# Altium footprint library agh_racing_2018.PcbLib: 166 footprints (part 4 of 11)
Each footprint in its own frame and in the unit in brackets; x right, y up, seen from the top. Pads: shape width x height; smd on the part's side, far side on the other; paste and mask are expansions set on the pad; w line width, h text height; cw(c..) or ccw(c..) is an arc to the next point about the centre after c.
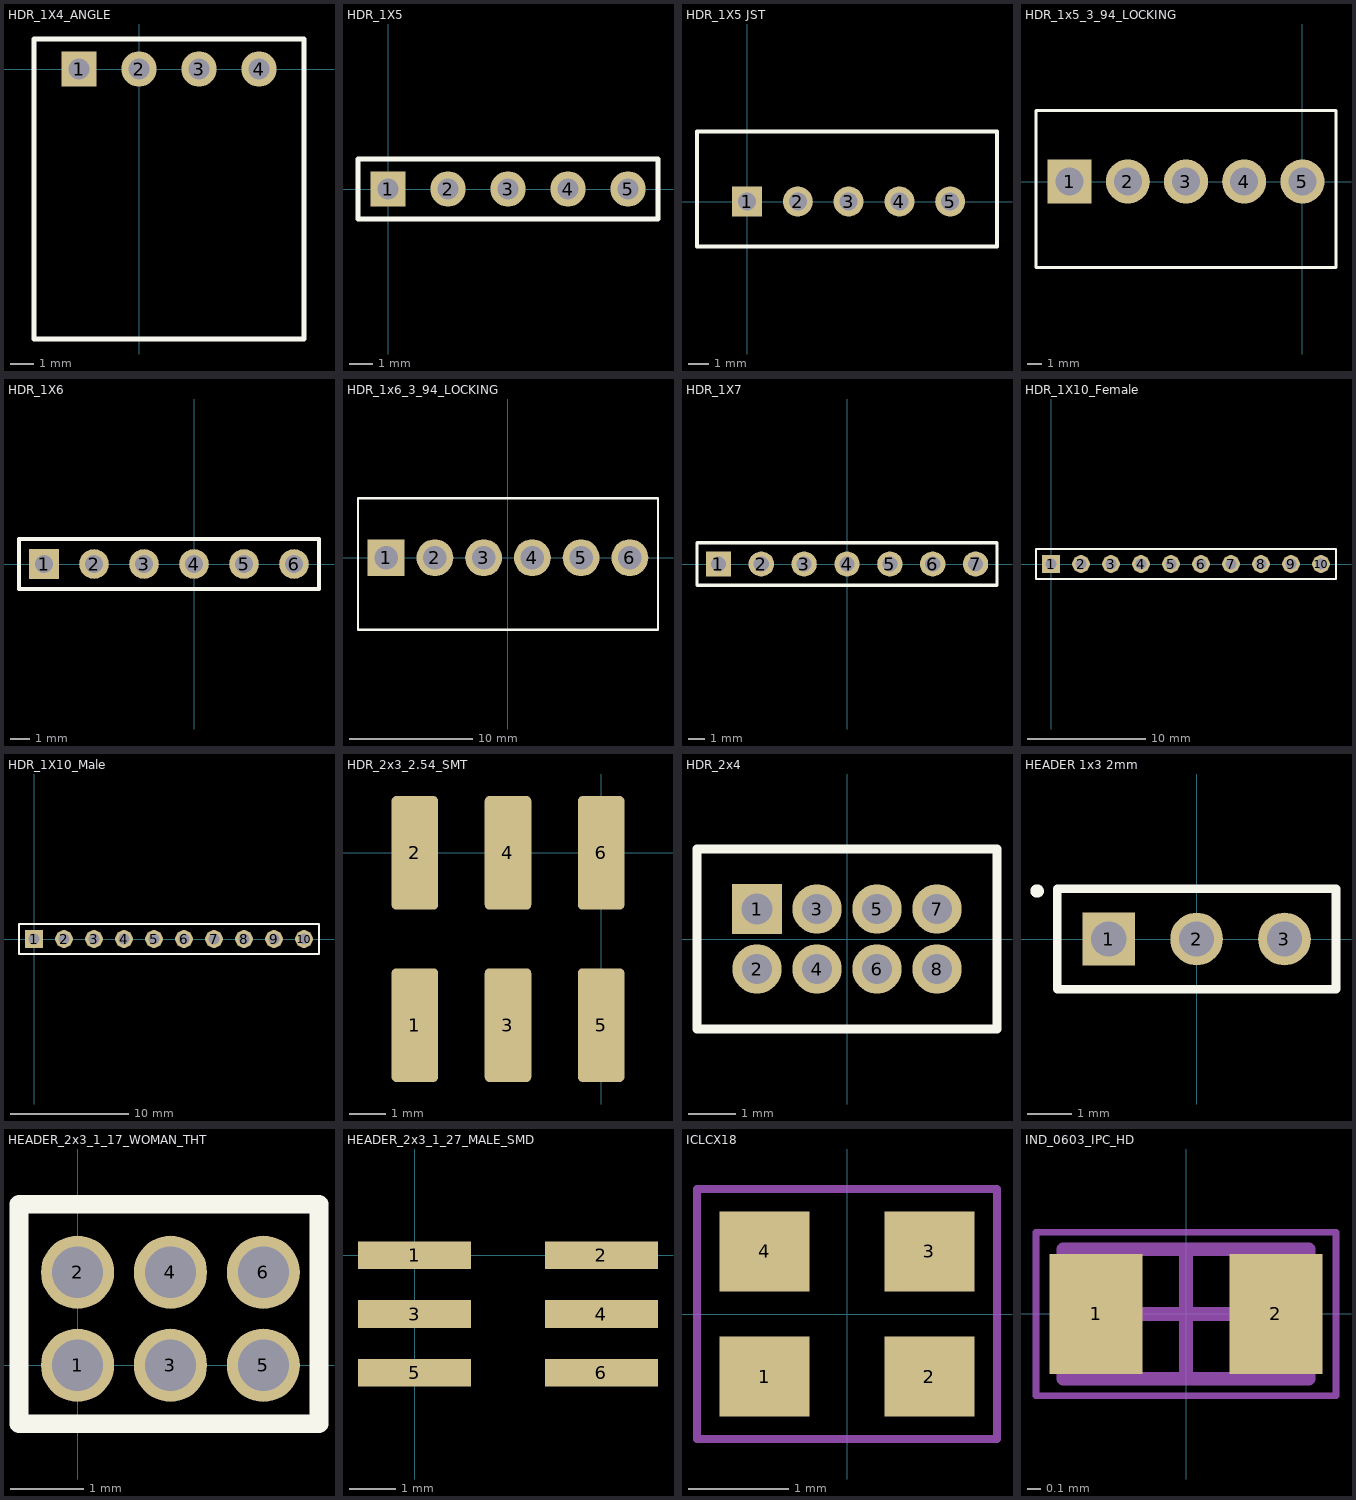
[diagram p3: the footprints below, top view; thin cyan lines are the x and y axes]

## HDR_1X4_ANGLE [mm] "Connector; Header; 3 Position"
pads (4):
  rect 1.5x1.5 hole 0.9: 1(-2.54,0)
  round 1.5 hole 0.9: 2(0,0) 3(2.54,0) 4(5.08,0)
Top Overlay:
  lines w0.2: -4.445,-11.43 6.985,-11.43 6.985,1.27 -4.445,1.27 -4.445,-11.43
3D body "c-0640457-02-s-3d.stp": height 5.84, standoff -3.55, extent 1.27,-10.733 6.35,0.316
3D body "c-0640457-02-s-3d.stp": height 5.84, standoff -3.55, extent -3.81,-10.733 1.27,0.316

## HDR_1X5 [mm] "Connector; Header; 5 Position"
pads (5):
  rect 1.5x1.5 hole 0.9: 1(0,0)
  round 1.5 hole 0.9: 2(2.54,0) 3(5.08,0) 4(7.62,0) 5(10.16,0)
Top Overlay:
  lines w0.2: -1.27,-1.27 11.43,-1.27 11.43,1.27 -1.27,1.27 -1.27,-1.27
3D body "DS1021-1x5SF11.stp": height 8.6, standoff -3, extent -1.27,-1.27 11.43,1.27

## HDR_1X5 JST [mm] "Connector; Header; 5 Position"
pads (5):
  rect 1.5x1.5 hole 0.9: 1(0,0)
  round 1.5 hole 0.9: 2(2.54,0) 3(5.08,0) 4(7.62,0) 5(10.16,0)
Top Overlay:
  lines w0.2: -2.5,-2.25 -2.5,3.5 12.5,3.5 12.5,-2.25 -2.5,-2.25
3D body "JST XH 5 B5B-XH-A.STEP": height 7, standoff -3.45, extent -2.395,-2.35 12.545,3.4

## HDR_1x5_3_94_LOCKING [mm]
pads (5):
  rect 3x3 hole 1.9: 1(-15.84,0)
  round 3 hole 1.9: 2(-11.88,0) 3(-7.92,0) 4(-3.96,0) 5(0,0)
Top Overlay:
  lines w0.2: -18.126,-5.842 -18.126,4.826 2.286,4.826 2.286,-5.842 -18.126,-5.842
3D body "Download_STP_645005114822.stp": height 13.85, standoff -3.6, extent -17.921,-5.605 1.989,4.598

## HDR_1X6 [mm]
pads (6):
  rect 1.5x1.5 hole 0.9: 1(-7.62,0)
  round 1.5 hole 0.9: 2(-5.08,0) 3(-2.54,0) 4(0,0) 5(2.54,0) 6(5.08,0)
Top Overlay:
  lines w0.2: -8.89,-1.27 1.27,-1.27 6.35,-1.27 6.35,1.27 1.27,1.27 -8.89,1.27 -8.89,-1.27
3D body "DS1021-1x3SF11.stp": height 8.6, standoff -3, extent -1.27,-1.27 6.35,1.27
3D body "DS1021-1x4SF11.stp": height 8.6, standoff -3, extent -8.89,-1.27 1.27,1.27

## HDR_1x6_3_94_LOCKING [mm]
pads (6):
  rect 3x3 hole 1.9: 1(-9.9,0)
  round 3 hole 1.9: 2(-5.94,0) 3(-1.98,0) 4(1.98,0) 5(5.94,0) 6(9.9,0)
Top Overlay:
  lines w0.2: -12.186,-5.842 -12.186,4.826 12.186,4.826 12.186,-5.842 -12.186,-5.842
3D body "Download_STP_645006114822.stp": height 13.85, standoff -3.6, extent -11.935,-5.605 11.935,4.597

## HDR_1X7 [mm]
pads (7):
  rect 1.5x1.5 hole 0.9: 1(-7.62,0)
  round 1.5 hole 0.9: 2(-5.08,0) 3(-2.54,0) 4(0,0) 5(2.54,0) 6(5.08,0) 7(7.62,0)
Top Overlay:
  lines w0.2: -8.89,-1.27 1.27,-1.27 8.89,-1.27 8.89,1.27 1.27,1.27 -8.89,1.27 -8.89,-1.27
3D body "DS1021-1x3SF11.stp": height 8.6, standoff -3, extent 1.27,-1.27 8.89,1.27
3D body "DS1021-1x4SF11.stp": height 8.6, standoff -3, extent -8.89,-1.27 1.27,1.27

## HDR_1X10_Female [mm] "Connector; Header; 10 Position"
height 8.5
pads (10):
  rect 1.5x1.5 hole 0.9: 1(0,0)
  round 1.5 hole 0.9: 2(2.54,0) 3(5.08,0) 4(7.62,0) 5(10.16,0) 6(12.7,0) 7(15.24,0) 8(17.78,0) 9(20.32,0) 10(22.86,0)
Top Overlay:
  lines w0.2: -1.27,-1.27 24.13,-1.27 24.13,1.27 0.635,1.27 -1.27,1.27 -1.27,-1.27
3D body "header1x10.stp": height 8.5, standoff -3.1, extent -1.52,-1.25 24.38,1.25

## HDR_1X10_Male [mm] "Connector; Header; 10 Position"
height 8.5
pads (10):
  rect 1.5x1.5 hole 0.9: 1(0,0)
  round 1.5 hole 0.9: 2(2.54,0) 3(5.08,0) 4(7.62,0) 5(10.16,0) 6(12.7,0) 7(15.24,0) 8(17.78,0) 9(20.32,0) 10(22.86,0)
Top Overlay:
  lines w0.2: -1.27,-1.27 -1.27,1.27 0.635,1.27 24.13,1.27 24.13,-1.27 -1.27,-1.27
3D body "header1x10 male.stp": height 8.57, standoff -2.97, extent -1.2,-1.27 24.2,1.27

## HDR_2x3_2.54_SMT [mm]
height 9.3
pads (6):
  rrect20% 1.27x3.1 smd: 1(-5.08,-4.7) 2(-5.08,0) 3(-2.54,-4.7) 4(-2.54,0) 5(0,-4.7) 6(0,0)
3D body "HDR_2x3_2.54_SMT.SLDPRT": height 9.31, standoff 0.01, extent -6.35,-6.096 1.27,1.404
3D body: height 0.25, standoff 0, extent -0.127,-2.057 -0.127,-2.057

## HDR_2x4 [mm]
pads (8):
  rect 1.06x1.06 hole 0.65: 1(-1.905,0.635)
  round 1.042 hole 0.635: 2(-1.905,-0.635) 3(-0.635,0.635) 4(-0.635,-0.635) 5(0.635,0.635) 6(0.635,-0.635) 7(1.905,0.635) 8(1.905,-0.635)
Top Overlay:
  lines w0.2: -3.175,-1.905 3.175,-1.905 3.175,1.905 -3.175,1.905 -3.175,-1.905

## HEADER 1x3 2mm [mm]
height 6
pads (3):
  rect 1.2x1.2 hole 0.8: 1(-2,0)
  round 1.2 hole 0.8: 2(0,0) 3(2,0)
Top Overlay:
  circle w0.254: c-3.632,1.092 r0.025
  lines w0.2: -3.175,-1.143 3.175,-1.143 3.175,1.143 -3.175,1.143 -3.175,-1.143
3D body "pin header 1x3 pitch 2mm heigth 5mm.STEP": height 6, standoff -2.7, extent -3,-1.016 3,0.984
3D body: height 1, standoff -1, extent 2.3,-2.5 2.3,-2.5

## HEADER_2x3_1_17_WOMAN_THT [mm]
height 4
pads (6):
  round 1 hole 0.7: 1(0,0) 2(0,1.27) 3(1.27,0) 4(1.27,1.27) 5(2.54,0) 6(2.54,1.27)
Top Overlay:
  lines w0.254: -0.8,-0.8 3.3,-0.8 3.3,2.2 -0.8,2.2 -0.8,-0.8
3D body: height 5.6, standoff 2.4, extent -0.625,-4.95 3.125,-0.35
3D body: height 4.1, standoff 3.9, extent 2.413,-0.362 2.638,1.363
3D body: height 4.1, standoff 3.9, extent 1.163,-0.362 1.388,1.363
3D body: height 4.1, standoff 3.9, extent -0.112,-0.337 0.113,1.388
3D body: height 3, standoff 2.6, extent 0.302,-1.123 0.302,-1.123
3D body: height 3, standoff 2.6, extent -1.525,1.375 -1.525,1.375
3D body: height 2.8, standoff 2.6, extent 2.415,-0.353 2.666,0.127
3D body: height 2.8, standoff 2.6, extent 1.145,-0.353 1.396,0.127
3D body: height 2.8, standoff 2.6, extent -0.125,-0.353 0.126,0.127
3D body: height 3, standoff 2.6, extent 0.748,-1.377 0.748,-1.377
3D body: height 3, standoff 2.6, extent 1.002,-1.123 1.002,-1.123
3D body: height 3, standoff 2.6, extent 1.002,-1.25 1.002,-1.25
3D body: height 2.6, standoff 2.6, extent -0.127,0 -0.127,0
3D body: height 2.6, standoff 2.6, extent -0.127,0 -0.127,0
3D body: height 4.1, standoff -0.9, extent -0.127,1.143 0.127,1.397
3D body: height 4.1, standoff -0.9, extent 1.143,1.143 1.397,1.397
3D body: height 4.1, standoff -0.9, extent 2.413,1.143 2.667,1.397
3D body: height 2.6, standoff -0.9, extent 2.413,-0.127 2.667,0.127
3D body: height 2.6, standoff -0.9, extent 1.143,-0.127 1.397,0.127
3D body: height 2.6, standoff -0.9, extent -0.127,-0.127 0.127,0.127
3D body: height 2.6, standoff 0, extent 0.635,-0.508 0.635,-0.508

## HEADER_2x3_1_27_MALE_SMD [mm]
pads (6):
  rect 2.45x0.6 smd: 1(0,0) 2(4.05,0) 3(0,-1.27) 4(4.05,-1.27) 5(0,-2.54) 6(4.05,-2.54)
3D body "pin_header_a-sl127-dg-g02mp1.stp": height 6.4, standoff 0, extent -0.727,-0.635 4.777,0.635
3D body "pin_header_a-sl127-dg-g02mp1.stp": height 6.4, standoff 0, extent -0.727,-1.905 4.777,-0.635
3D body "pin_header_a-sl127-dg-g02mp1.stp": height 6.4, standoff 0, extent -0.727,-3.175 4.777,-1.905

## ICLCX18 [mm]
pads (4):
  rect 0.9x0.8 smd: 1(-0.825,-0.625) 2(0.825,-0.625) 3(0.825,0.625) 4(-0.825,0.625)
Mechanical 15:
  lines w0.076: -1.5,-1.25 1.5,-1.25 1.5,1.25 -1.5,1.25 -1.5,-1.25
3D body: height 0.8, standoff 0, extent -1.25,-1 1.25,1

## IND_0603_IPC_HD [mm] "Chip Inductor, 2-Leads, Body 1.60x0.80mm, IPC High Density"
height 0.95
pads (2):
  rect 0.68x0.88 smd: 1(-0.66,0) 2(0.66,0)
Mechanical 13:
  lines w0.1: -0.9,-0.475 -0.9,0.475 0.9,0.475 0.9,-0.475 -0.9,-0.475
Mechanical 15:
  lines w0.05: -1.1,-0.6 -1.1,0.6 1.1,0.6 1.1,-0.6 -1.1,-0.6
  lines w0.1: -0.475,0 0.475,0 ; 0,-0.475 0,0.475
3D body "IND_0603_IPC_HD.step": height 0.95, standoff 0, extent -0.9,-0.475 0.9,0.475